# Altium footprint library adafruit.PCBLIB: 648 footprints (part 32 of 41)
Each footprint in its own frame and in the unit in brackets; x right, y up, seen from the top. Pads: shape width x height; smd on the part's side, far side on the other; paste and mask are expansions set on the pad; w line width, h text height; cw(c..) or ccw(c..) is an arc to the next point about the centre after c.
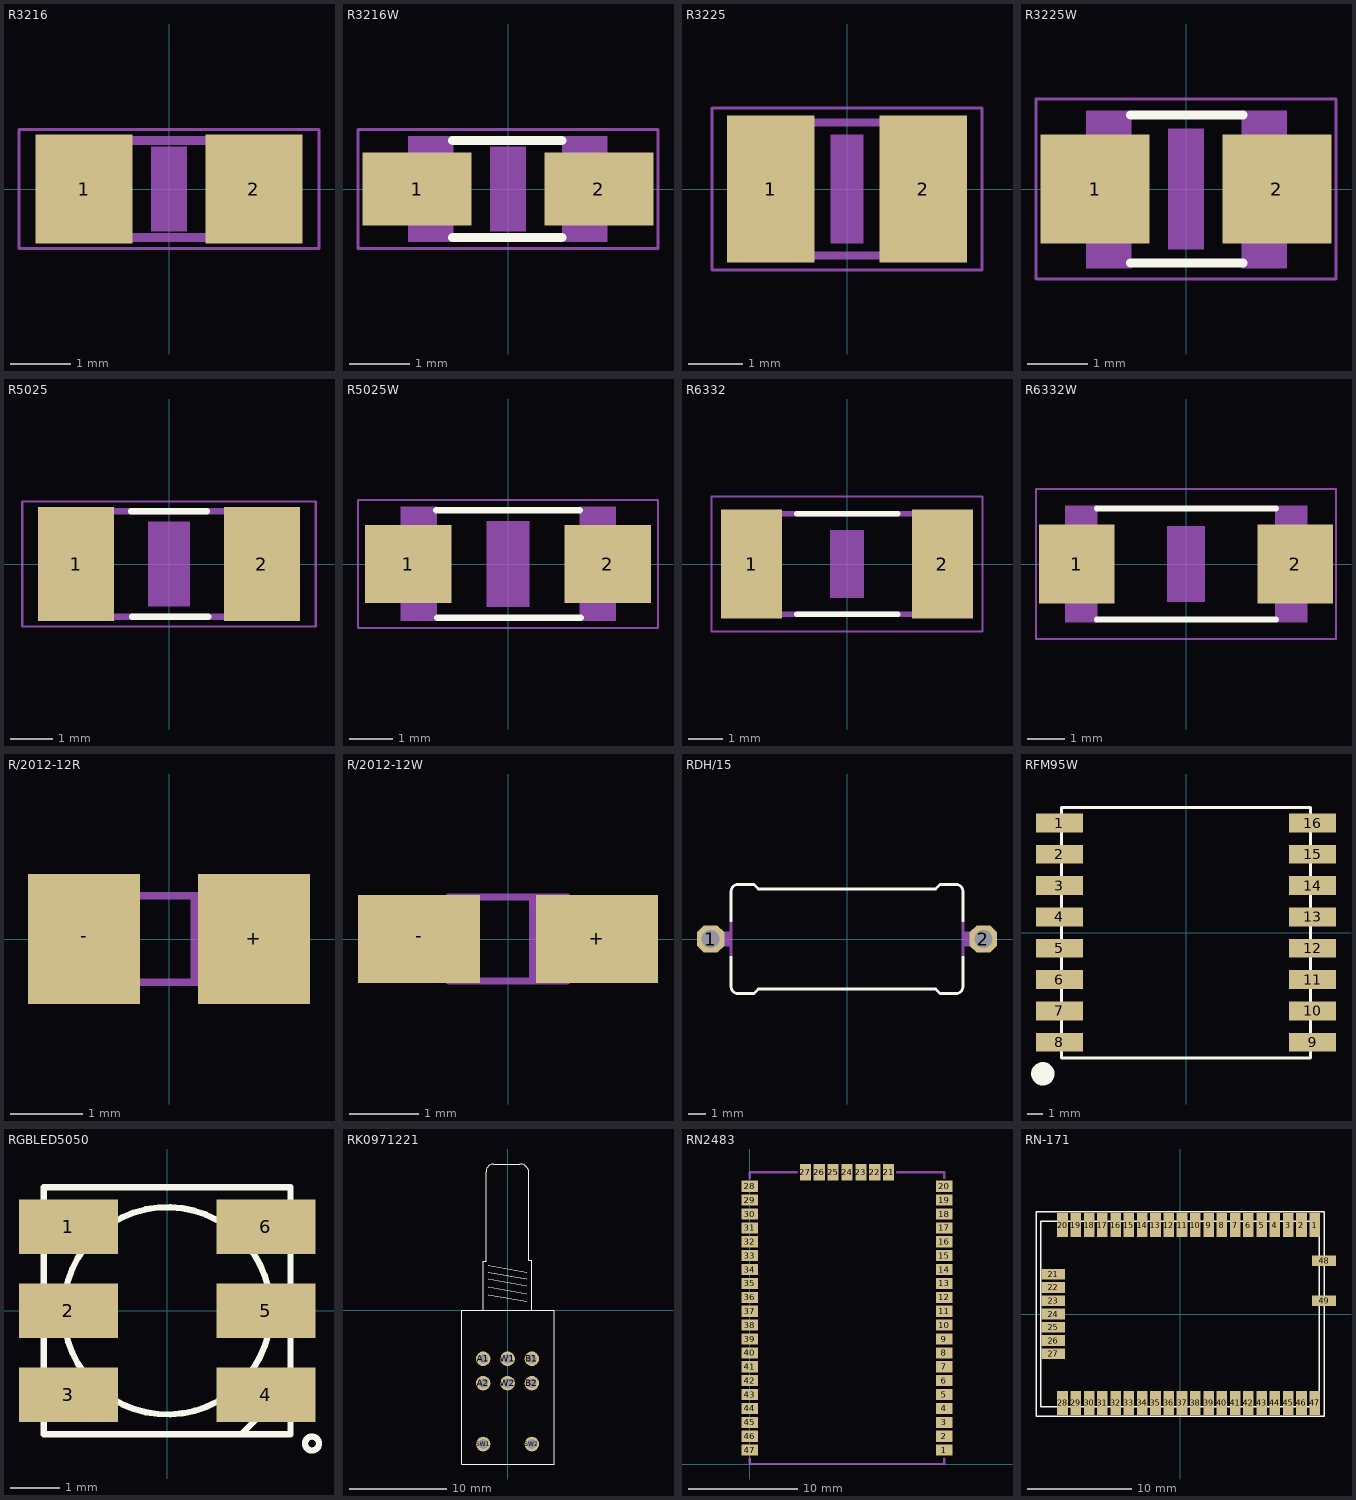
[diagram p31: the footprints below, top view; thin cyan lines are the x and y axes]

## R3216 [mil]
pads (2):
  rect 62.99x70.87 smd: 1(-55.12,0) 2(55.12,0)
Mechanical 6:
  rectangle: -11.81,-27.56 11.81,27.56
Mechanical 16:
  rectangle: 35,-34.5 64.53,34.4
  rectangle: -65,-34.5 -35.47,34.4
  lines w6: -35.94,-31.5 34.96,-31.5 ; -35.94,31.5 34.96,31.5
Mechanical 27:
  lines w2: -97.36,-38.7 -97.36,38.7 97.36,38.7 97.36,-38.7 -97.36,-38.7

## R3216W [mil]
pads (2):
  rect 70.87x47.24 smd: 1(-59.02,0) 2(59.02,0)
Top Overlay:
  lines w6: -35.94,-31.5 34.96,-31.5 ; -35.94,31.5 34.96,31.5
Mechanical 6:
  rectangle: -11.81,-27.56 11.81,27.56
Mechanical 16:
  rectangle: -65,-34.5 -35.47,34.4
  rectangle: 35,-34.5 64.53,34.4
Mechanical 27:
  lines w2: -97.36,-38.7 97.36,-38.7 97.36,38.7 -97.36,38.7 -97.36,-38.7

## R3225 [mil]
pads (2):
  rect 62.99x106.3 smd: 1(-55.12,0) 2(55.12,0)
Mechanical 6:
  rectangle: -11.81,-39.37 11.81,39.37
Mechanical 16:
  rectangle: -65,-51.5 -35.47,50.86
  rectangle: 36,-51.5 65.53,50.86
  lines w6: -35.94,-47.99 36.97,-47.99 ; -35.94,47.99 36.97,47.99
Mechanical 27:
  lines w2: -97.36,-58.39 97.36,-58.39 97.36,58.39 -97.36,58.39 -97.36,-58.39

## R3225W [mil]
pads (2):
  rect 70.87x70.87 smd: 1(-59.02,0) 2(59.02,0)
Top Overlay:
  lines w6: -35.94,-47.99 36.97,-47.99 ; -35.94,47.99 36.97,47.99
Mechanical 6:
  rectangle: -11.81,-39.37 11.81,39.37
Mechanical 16:
  rectangle: 36,-51.5 65.53,50.86
  rectangle: -65,-51.5 -35.47,50.86
Mechanical 27:
  lines w2: -97.36,-58.39 -97.36,58.39 97.36,58.39 97.36,-58.39 -97.36,-58.39

## R5025 [mil]
pads (2):
  rect 70.87x106.3 smd: 1(-86.61,0) 2(86.61,0)
Top Overlay:
  lines w6: -35.43,49.02 35.43,49.02 ; -34.45,-49.02 36.42,-49.02
Mechanical 6:
  rectangle: -19.69,-39.37 19.69,39.37
Mechanical 16:
  rectangle: -98,-52 -64.54,52.33
  rectangle: 65,-52 98.46,52.33
  lines w6: -65.43,49.02 65.43,49.02 ; -64.45,-49.02 66.42,-49.02
Mechanical 27:
  lines w2: -136.73,-58.39 136.73,-58.39 136.73,58.39 -136.73,58.39 -136.73,-58.39

## R5025W [mm]
pads (2):
  rect 2x1.8 smd: 1(-2.311,0) 2(2.311,0)
Top Overlay:
  lines w0.152: -1.662,1.245 1.662,1.245 ; -1.637,-1.245 1.687,-1.245
Mechanical 6:
  rectangle: -0.5,-1 0.5,1
Mechanical 16:
  rectangle: -2.489,-1.321 -1.639,1.329
  rectangle: 1.651,-1.321 2.501,1.329
Mechanical 27:
  lines w0.051: -3.473,-1.483 3.473,-1.483 3.473,1.483 -3.473,1.483 -3.473,-1.483

## R6332 [mil]
pads (2):
  rect 70.87x125.98 smd: 1(-110.24,0) 2(110.24,0)
Top Overlay:
  lines w6: -57.99,-57.99 58.98,-57.99 ; -57.99,57.99 58.98,57.99
Mechanical 6:
  rectangle: -19.69,-39.37 19.69,39.37
Mechanical 16:
  rectangle: -126,-61 -92.54,61.05
  rectangle: 93,-61 126.46,61.05
  lines w6: -92.99,-57.99 93.98,-57.99 ; -92.99,57.99 93.98,57.99
Mechanical 27:
  lines w2: -156.42,-78.07 156.42,-78.07 156.42,78.07 -156.42,78.07 -156.42,-78.07

## R6332W [mm]
pads (2):
  rect 2x2.1 smd: 1(-2.896,0) 2(2.896,0)
Top Overlay:
  lines w0.152: -2.362,-1.473 2.387,-1.473 ; -2.362,1.473 2.387,1.473
Mechanical 6:
  rectangle: -0.5,-1 0.5,1
Mechanical 16:
  rectangle: -3.2,-1.549 -2.351,1.551
  rectangle: 2.362,-1.549 3.212,1.551
Mechanical 27:
  lines w0.051: -3.973,-1.983 3.973,-1.983 3.973,1.983 -3.973,1.983 -3.973,-1.983

## R/2012-12R [mm]
pads (2):
  rect 1.55x1.8 smd: +(1.175,0) -(-1.175,0)
Mechanical 16:
  rectangle: -1,-0.45 -0.875,0.45
  rectangle: 0.875,-0.45 1,0.45
  rectangle: 0.3,-0.625 0.5,0.625
  lines w0.102: -0.85,-0.6 0.85,-0.6 0.85,0.6 -0.85,0.6 -0.85,-0.6

## R/2012-12W [mil]
pads (2):
  rect 68.9x49.61 smd: +(50.2,0) -(-50.2,0)
Mechanical 16:
  rectangle: 11.81,-24.61 19.69,24.61
  rectangle: 34.45,-17.72 39.37,17.72
  rectangle: -39.37,-17.72 -34.45,17.72
  lines w4: -33.46,-23.62 -33.46,23.62 33.46,23.62 33.46,-23.62 -33.46,-23.62

## RDH/15 [mil]
pads (2):
  oct 60x60 hole 40: 1(-300,0) 2(300,0)
Top Overlay:
  lines w6: -255,-40 -255,-105 ccw(c-240,-105) -240,-120 -205,-120 -195,-110 195,-110 205,-120 240,-120 ccw(c240,-105) 255,-105 255,-40 ; -255,40 -255,105 cw(c-240,105) -240,120 -205,120 -195,110 195,110 205,120 240,120 cw(c240,105) 255,105 255,40
Mechanical 16:
  rectangle: 254,-16 266,16
  rectangle: -266,-16 -254,16
  lines w6: -255,-40 -255,40 ; 255,-40 255,40
  lines w32: -300,0 -270,0 ; 270,0 300,0
  text "RDH" at 180,-68 h77.5

## RFM95W [mm] "LoRA RFM95"
pads (16):
  rect 3x1.2 smd: 1(-8.08,7) 2(-8.08,5) 3(-8.08,3) 4(-8.08,1) 5(-8.08,-1) 6(-8.08,-3) 7(-8.08,-5) 8(-8.08,-7) 9(8.08,-7) 10(8.08,-5) 11(8.08,-3) 12(8.08,-1) 13(8.08,1) 14(8.08,3) 15(8.08,5) 16(8.08,7)
Top Overlay:
  lines w0.203: -7.945,-8 -7.945,8 7.945,8 7.945,-8 -7.945,-8
  lines w0.889: -8.856,-8.935 ccw(c-9.144,-9.017) -8.844,-9.017

## RGBLED5050 [mm]
pads (6):
  rect 2x1.1 smd: 1(-2,1.7) 2(-2,0) 3(-2,-1.7) 4(2,-1.7) 5(2,0) 6(2,1.7)
Top Overlay:
  circle w0.127: c0,0 r2.1
  circle w0.127: c2.934,-2.688 r0.141
  lines w0.127: 1.5,-2.5 2.5,-1.5 ; 1.5,-2.5 -2.5,-2.5 -2.5,2.5 2.5,2.5 2.5,-1.5 ; 1.5,-2.5 2.5,-2.5 2.5,-1.5

## RK0971221 [mm]
pads (8):
  round 1.5 hole 1: A1(-2.5,-5) A2(-2.5,-7.5) B1(2.5,-5) B2(2.5,-7.5) SW1(-2.5,-13.75) SW2(2.5,-13.75) W1(0,-5) W2(0,-7.5)
Top Overlay:
  lines w0.127: -2,1.6 2,0.9 ; -2,2.4 2,1.7 ; -2,3.2 2,2.5 ; -2,3.9 2,3.2 ; -2,4.6 2,3.9 ; -2.5,0 -2.5,5 -2.2,5 -2.2,14.219 cw(c-1.419,14.219) -1.419,15 1.278,15 cw(c1.278,14.078) 2.2,14.078 2.2,5.1 2.5,5.1 2.5,0 ; -2.5,0 -4.7,0 -4.7,-15.8 4.8,-15.8 4.8,0 2.5,0 ; -2.5,0 2.5,0

## RN2483 [mil]
pads (47):
  rect 60x40 smd: 1(700,50) 2(700,100) 3(700,150) 4(700,200) 5(700,250) 6(700,300) 7(700,350) 8(700,400) 9(700,450) 10(700,500) 11(700,550) 12(700,600) 13(700,650) 14(700,700) 15(700,750) 16(700,800) 17(700,850) 18(700,900) 19(700,950) 20(700,1000) 28(0,1000) 29(0,950) 30(0,900) 31(0,850) 32(0,800) 33(0,750) 34(0,700) 35(0,650) 36(0,600) 37(0,550) 38(0,500) 39(0,450) 40(0,400) 41(0,350) 42(0,300) 43(0,250) 44(0,200) 45(0,150) 46(0,100) 47(0,50)
  rect 40x60 smd: 21(500,1050) 22(450,1050) 23(400,1050) 24(350,1050) 25(300,1050) 26(250,1050) 27(200,1050)
Mechanical 2:
  lines w8: 0,20 0,0 700,0 700,20 ; 0,1030 0,1050 170,1050 ; 530,1050 700,1050 700,1030

## RN-171 [mil]
pads (49):
  rect 40x90 smd: 1(507.5,335) 2(457.5,335) 3(407.5,335) 4(357.5,335) 5(307.5,335) 6(257.5,335) 7(207.5,335) 8(157.5,335) 9(107.5,335) 10(57.5,335) 11(7.5,335) 12(-42.5,335) 13(-92.5,335) 14(-142.5,335) 15(-192.5,335) 16(-242.5,335) 17(-292.5,335) 18(-342.5,335) 19(-392.5,335) 20(-442.5,335) 28(-442.5,-335) 29(-392.5,-335) 30(-342.5,-335) 31(-292.5,-335) 32(-242.5,-335) 33(-192.5,-335) 34(-142.5,-335) 35(-92.5,-335) 36(-42.5,-335) 37(7.5,-335) 38(57.5,-335) 39(107.5,-335) 40(157.5,-335) 41(207.5,-335) 42(257.5,-335) 43(307.5,-335) 44(357.5,-335) 45(407.5,-335) 46(457.5,-335) 47(507.5,-335)
  rect 90x40 smd: 21(-477.5,150) 22(-477.5,100) 23(-477.5,50) 24(-477.5,0) 25(-477.5,-50) 26(-477.5,-100) 27(-477.5,-150) 48(542.5,200) 49(542.5,50)
Top Overlay:
  lines w5: -542.5,-385 542.5,-385 542.5,385 -542.5,385 -542.5,-385 ; -525,-350 525,-350 525,350 -525,350 -525,-350